# Altium footprint library Eis_Lib.PcbLib: 75 footprints (part 4 of 5)
Each footprint in its own frame and in the unit in brackets; x right, y up, seen from the top. Pads: shape width x height; smd on the part's side, far side on the other; paste and mask are expansions set on the pad; w line width, h text height; cw(c..) or ccw(c..) is an arc to the next point about the centre after c.
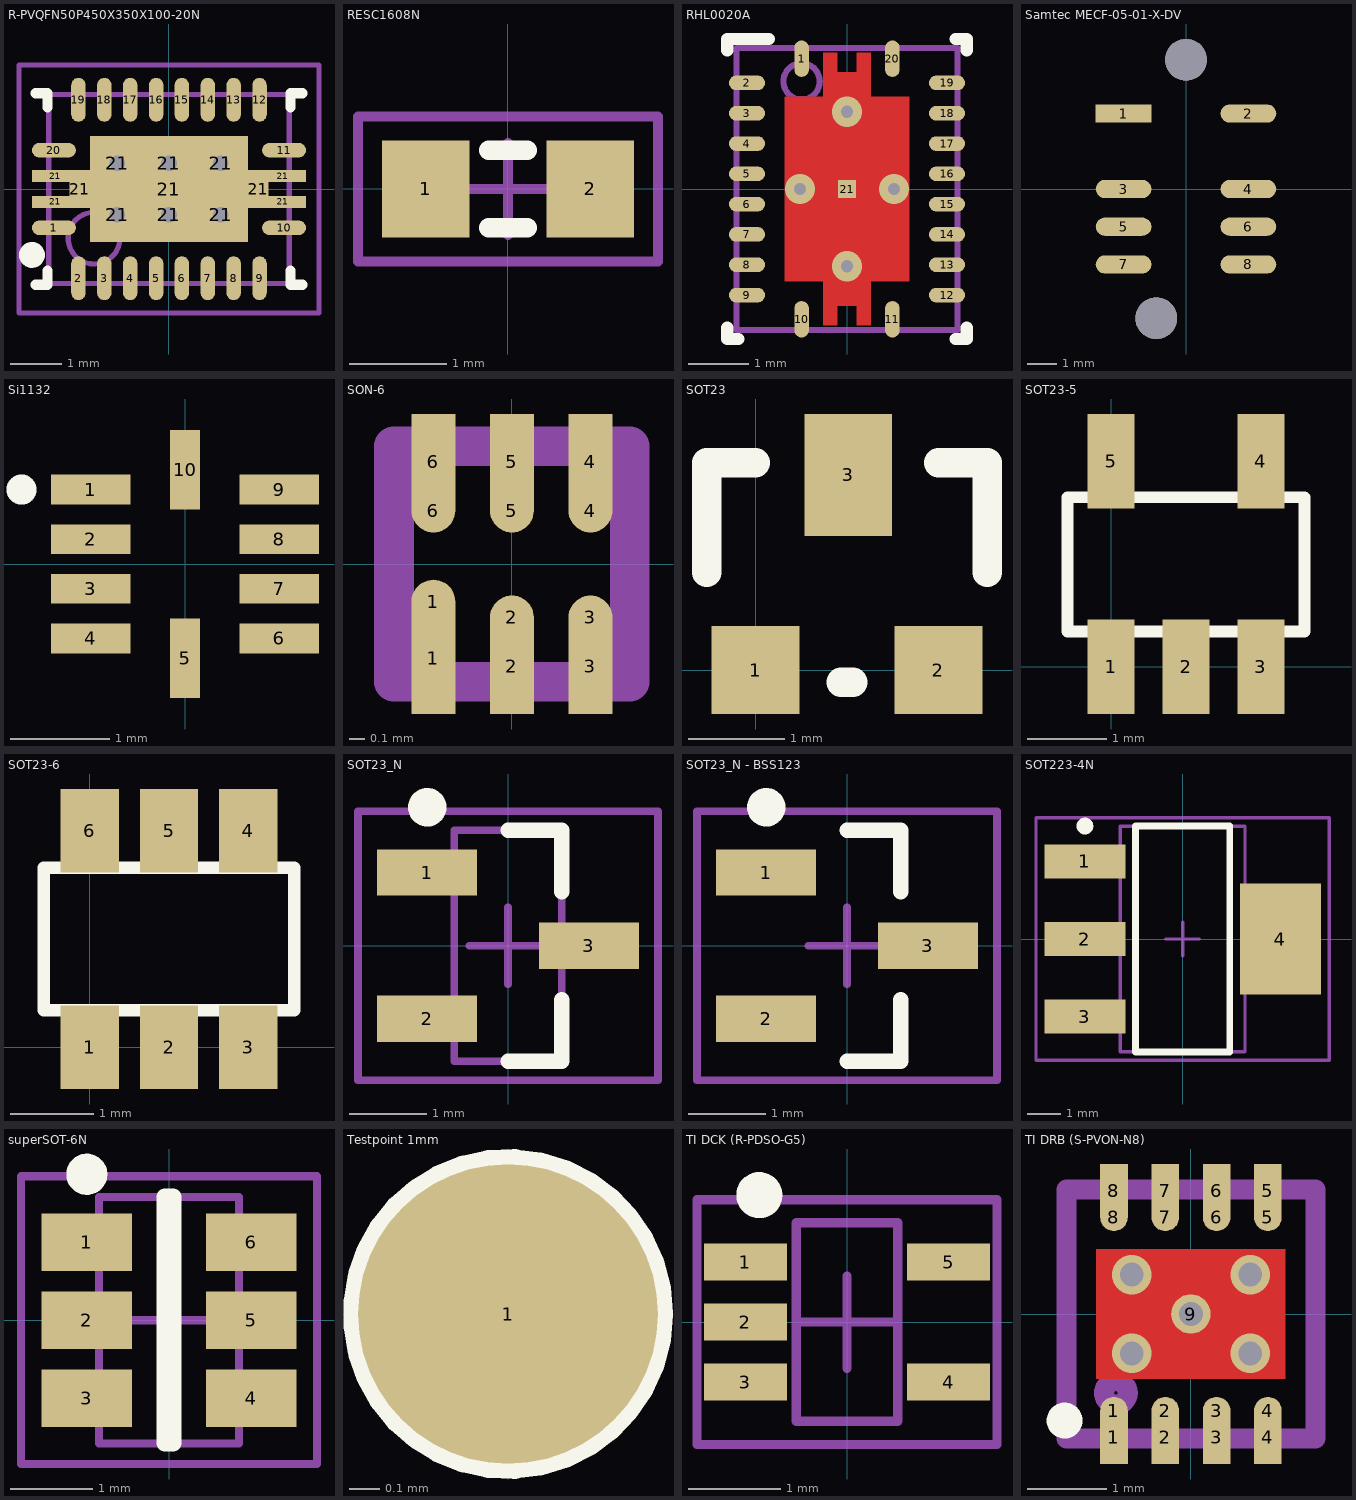
[diagram p3: the footprints below, top view; thin cyan lines are the x and y axes]

## R-PVQFN50P450X350X100-20N [mm] "R-PVQFN-N20, 20-Leads, Body 3,7x4,7mm (max), Pitch 0,50mm, IPC Medium Density"
height 1
pads (33):
  oval 0.85x0.28 smd mask+0.02: 1(-2.225,-0.75) 10(2.225,-0.75) 11(2.225,0.75) 20(-2.225,0.75)
  oval 0.28x0.85 smd mask+0.02: 2(-1.75,-1.725) 3(-1.25,-1.725) 4(-0.75,-1.725) 5(-0.25,-1.725) 6(0.25,-1.725) 7(0.75,-1.725) 8(1.25,-1.725) 9(1.75,-1.725) 12(1.75,1.725) 13(1.25,1.725) 14(0.75,1.725) 15(0.25,1.725) 16(-0.25,1.725) 17(-0.75,1.725) 18(-1.25,1.725) 19(-1.75,1.725)
  rect 0.9x0.23 smd mask+0.02: 21(-2.2,-0.25) 21(-2.2,0.25) 21(2.2,-0.25) 21(2.2,0.25)
  rect 0.4x0.73 smd paste-1 mask+0.02: 21(-1.725,0) 21(1.725,0)
  round 0.6 hole 0.3 paste-1 mask+0.02: 21(-1,-0.5) 21(-1,0.5) 21(0,-0.5) 21(0,0.5) 21(1,-0.5) 21(1,0.5)
  rect 3.05x2.05 smd paste-3 mask+0.02: 21(0,0)
Top Overlay:
  circle w0.25: c-2.65,-1.275 r0.125
  lines w0.2: -2.575,-1.85 -2.35,-1.85 -2.35,-1.575 ; -2.575,1.85 -2.35,1.85 -2.35,1.575 ; 2.35,-1.575 2.35,-1.85 2.575,-1.85 ; 2.35,1.575 2.35,1.85 2.575,1.85
Top Paste:
  rectangle: -1.47,-0.97 -0.15,-0.15
  rectangle: 0.15,-0.97 1.47,-0.15
  rectangle: 0.15,0.15 1.47,0.97
  rectangle: -1.47,0.15 -0.15,0.97
Mechanical 13:
  circle w0.1: c-1.45,-0.95 r0.5
  lines w0.1: -2.325,-1.825 2.325,-1.825 2.325,1.825 -2.325,1.825 -2.325,-1.825
Mechanical 15:
  lines w0.1: -0.5,0 0.5,0 ; 0,-0.5 0,0.5 ; -2.9,-2.4 2.9,-2.4 2.9,2.4 -2.9,2.4 -2.9,-2.4
3D body: height 1, standoff 0.01, extent -2.325,-1.825 2.325,1.825

## RESC1608N [mm] "Chip Resistor, Body 1.6x0.8mm, IPC Medium Density"
height 0.6
pads (2):
  rect 0.9x1 smd: 1(-0.85,0) 2(0.85,0)
Top Overlay:
  lines w0.2: -0.2,-0.4 0.2,-0.4 ; -0.2,0.4 0.2,0.4
Mechanical 15:
  lines w0.1: -0.475,0 0.475,0 ; 0,-0.475 0,0.475 ; -1.55,-0.75 -1.55,0.75 1.55,0.75 1.55,-0.75 -1.55,-0.75
3D body: height 0.45, standoff -0.02, extent -0.8,-0.4 0.8,0.4

## RHL0020A [mm] "QFN, 20-Leads, Body 4.5x3.5mm, Pitch 0.5mm, Thermal Pad 3.05x2.05mm, TI Recommended"
height 1
pads (21):
  oval 0.24x0.6 smd: 1(-0.75,2.15) 10(-0.75,-2.15) 11(0.75,-2.15) 20(0.75,2.15)
  oval 0.6x0.24 smd: 2(-1.65,1.75) 3(-1.65,1.25) 4(-1.65,0.75) 5(-1.65,0.25) 6(-1.65,-0.25) 7(-1.65,-0.75) 8(-1.65,-1.25) 9(-1.65,-1.75) 12(1.65,-1.75) 13(1.65,-1.25) 14(1.65,-0.75) 15(1.65,-0.25) 16(1.65,0.25) 17(1.65,0.75) 18(1.65,1.25) 19(1.65,1.75)
  rect 0.3x0.3 smd paste-0.15 mask+0: 21(0,0)
via 0,-1.275 diameter 0.5 hole 0.2
via 0.775,0 diameter 0.5 hole 0.2
via 0,1.275 diameter 0.5 hole 0.2
via -0.775,0 diameter 0.5 hole 0.2
Top Layer:
  region: 0.16,2.25 0.16,1.925 -0.16,1.925 -0.16,2.25 -0.39,2.25 -0.39,1.525 -1.025,1.525 -1.025,-1.525 -0.39,-1.525 -0.39,-2.25 -0.16,-2.25 -0.16,-1.925 0.16,-1.925 0.16,-2.25 0.39,-2.25 0.39,-1.525 1.025,-1.525 1.025,1.525 0.39,1.525 0.39,2.25
Top Overlay:
  lines w0.2: -1.975,-2.29 -1.975,-2.475 -1.79,-2.475 ; -1.975,2.29 -1.975,2.475 -1.29,2.475 ; 1.79,-2.475 1.975,-2.475 1.975,-2.29 ; 1.79,2.475 1.975,2.475 1.975,2.29
Top Paste:
  rectangle: -0.39,-1.925 0.39,-1.628
  rectangle: -0.39,1.628 0.39,1.925
  rectangle: 0.1,0.1 1.017,1.428
  region: -0.1,1.428 -1.017,1.428 -1.017,0.1 -0.1,0.1
  region: -0.1,-0.1 -1.017,-0.1 -1.017,-1.428 -0.1,-1.428
  rectangle: 0.1,-1.428 1.017,-0.1
Mechanical 5:
  circle w0.1: c-0.75,1.775 r0.3
  lines w0.1: -1.825,-2.325 -1.825,2.325 1.825,2.325 1.825,-2.325 -1.825,-2.325
  text ".Designator" at -0.355,-0.648 h0.76
3D body: height 1.01, standoff 0.5, extent -1.049,1.476 -0.451,2.074
3D body: height 1, standoff 0, extent -1.825,-2.325 1.825,2.325

## Samtec MECF-05-01-X-DV [mm]
pads (10):
  rect 1.88x0.61 smd: 1(-2.1,2.54)
  oval 1.88x0.61 smd: 2(2.1,2.54) 3(-2.1,0) 4(2.1,0) 5(-2.1,-1.27) 6(2.1,-1.27) 7(-2.1,-2.54) 8(2.1,-2.54)
  round 1.4 hole 1.4: ""(-1,-4.35) ""(0,4.35)
3D body: height 8.75, standoff -1.3, extent -2.801,-5.232 2.801,5.232

## Si1132 [mm] "QFN, 2.5x2.5mm, 10polig - für Si1132-Sensor"
height 0.65
pads (10):
  rect 0.8x0.3 smd: 1(-0.95,0.75) 2(-0.95,0.25) 3(-0.95,-0.25) 4(-0.95,-0.75) 6(0.95,-0.75) 7(0.95,-0.25) 8(0.95,0.25) 9(0.95,0.75)
  rect 0.3x0.8 smd: 5(0,-0.95) 10(0,0.95)
Top Overlay:
  circle w0.254: c-1.65,0.75 r0.025
3D body: height 0.65, standoff 0, extent -1.25,-1.25 1.25,1.25

## SON-6 [mm] "DSE-Package 1,5x1,5mm 6polig z. B. TPS72718"
pads (12):
  rect 0.28x0.71 smd mask+0.03: 1(-0.5,-0.6)
  round 0.28 smd mask+0.03: 1(-0.5,-0.24) 2(0,-0.34) 3(0.5,-0.34) 4(0.5,0.34) 5(0,0.34) 6(-0.5,0.34)
  rect 0.28x0.61 smd mask+0.03: 2(0,-0.65) 3(0.5,-0.65) 4(0.5,0.65) 5(0,0.65) 6(-0.5,0.65)
Mechanical 13:
  lines w0.254: -0.75,-0.75 0.75,-0.75 0.75,0.75 -0.75,0.75 -0.75,-0.75
3D body: height 0.7, standoff 0.05, extent -0.749,-0.749 0.749,0.749

## SOT23 [mil] "SOT23"
pads (3):
  rect 36x36 smd: 1(0,0) 2(75,0)
  rect 36x50 smd: 3(38,80)
Top Overlay:
  lines w12: -20,40 -20,85 0,85 ; 35,-5 40,-5 ; 75,85 95,85 95,40
3D body: height 40.16, standoff 0, extent -18.11,-9.84 96.85,87.64

## SOT23-5 [mm]
pads (5):
  rect 0.6x1.2 smd: 1(0,0) 2(0.95,0) 3(1.9,0) 4(1.9,2.6) 5(0,2.6)
Top Overlay:
  lines w0.15: -0.55,0.445 -0.55,2.145 2.45,2.145 2.45,0.445 -0.55,0.445
3D body: height 1.1, standoff 0, extent -0.499,-0.2 2.4,2.6

## SOT23-6 [mm]
height 3
pads (6):
  rect 0.7x1 smd: 1(0,0) 2(0.95,0) 3(1.9,0) 4(1.9,2.59) 5(0.95,2.59) 6(0,2.59)
Top Overlay:
  lines w0.15: -0.55,0.445 -0.55,2.145 2.45,2.145 2.45,0.445 -0.55,0.445
3D body: height 1.09, standoff 0, extent -0.444,0.146 2.35,2.572

## SOT23_N [mm] "SOT23, 3-Leads, Body 2.9x1.3mm, Pitch 0.95mm, Lead Span 2.3mm, IPC Medium Density"
height 1.1
pads (3):
  rect 1.3x0.6 smd: 1(-1.05,0.95) 2(-1.05,-0.95) 3(1.05,0)
Top Overlay:
  circle w0.25: c-1.05,1.8 r0.125
  lines w0.2: 0,-1.5 0.7,-1.5 0.7,-0.7 ; 0,1.5 0.7,1.5 0.7,0.7
Mechanical 13:
  lines w0.1: -0.7,-1.5 -0.7,1.5 0.7,1.5 0.7,-1.5 -0.7,-1.5
Mechanical 15:
  lines w0.1: -0.5,0 0.5,0 ; 0,-0.5 0,0.5 ; -1.95,-1.75 -1.95,1.75 1.95,1.75 1.95,-1.75 -1.95,-1.75
3D body: height 1.1, standoff 0, extent -0.7,-1.5 0.7,1.5

## SOT23_N - BSS123 [mm] "SOT23, 3-Leads, Body 2.9x1.3mm, Pitch 0.95mm, Lead Span 2.3mm, IPC Medium Density"
height 1.1
pads (3):
  rect 1.3x0.6 smd: 1(-1.05,0.95) 2(-1.05,-0.95) 3(1.05,0)
Top Overlay:
  circle w0.25: c-1.05,1.8 r0.125
  lines w0.2: 0,-1.5 0.7,-1.5 0.7,-0.7 ; 0,1.5 0.7,1.5 0.7,0.7
Mechanical 15:
  lines w0.1: -0.5,0 0.5,0 ; 0,-0.5 0,0.5 ; -1.95,-1.75 1.95,-1.75 1.95,1.75 -1.95,1.75 -1.95,-1.75
3D body: height 1, standoff 0, extent -1.15,-1.45 1.15,1.45

## SOT223-4N [mm] "SOT223, 4-Leads, Body 6.5x3.5mm, Pitch 2.3mm, Lead Span 7mm, IPC Medium Density"
height 1.7
pads (4):
  rect 2.4x1 smd: 1(-2.9,2.3) 2(-2.9,0) 3(-2.9,-2.3)
  rect 2.4x3.3 smd: 4(2.9,0)
Top Overlay:
  circle w0.25: c-2.9,3.35 r0.125
  lines w0.2: -1.4,-3.35 -1.4,3.35 1.4,3.35 1.4,-3.35 -1.4,-3.35
Mechanical 13:
  lines w0.1: -1.85,-3.35 -1.85,3.35 1.85,3.35 1.85,-3.35 -1.85,-3.35
Mechanical 15:
  lines w0.1: -0.5,0 0.5,0 ; 0,-0.5 0,0.5 ; -4.35,-3.6 -4.35,3.6 4.35,3.6 4.35,-3.6 -4.35,-3.6
3D body: height 1.7, standoff 0, extent -1.85,-3.35 1.85,3.35

## superSOT-6N [mm] "SOT23, 6-Leads, Body 3,0x2,6mm (max), Pitch 0,95mm, IPC Medium Density"
height 1.1
pads (6):
  rect 1.1x0.7 smd mask+0.05: 1(-1,0.95) 2(-1,0) 3(-1,-0.95) 4(1,-0.95) 5(1,0) 6(1,0.95)
Top Overlay:
  circle w0.25: c-1,1.775 r0.125
  lines w0.2: -0.05,-1.5 0.05,-1.5 0.05,1.5 -0.05,1.5 -0.05,-1.5
Mechanical 13:
  lines w0.1: -0.85,-1.5 -0.85,1.5 0.85,1.5 0.85,-1.5 -0.85,-1.5
Mechanical 15:
  lines w0.1: -0.5,0 0.5,0 ; 0,-0.5 0,0.5 ; -1.8,-1.75 -1.8,1.75 1.8,1.75 1.8,-1.75 -1.8,-1.75
3D body: height 1.1, standoff 0.05, extent -0.85,-1.5 0.85,1.5

## Testpoint 1mm [mm] "Testpoint 1mm"
height 1.75
pads (1):
  round 1 smd paste-1: 1(0,0)
Top Overlay:
  circle w0.1: c0,0 r0.5
Mechanical 11:
  lines w0.1: -0.225,0 0.225,0 ; 0,-0.225 0,0.225

## TI DCK (R-PDSO-G5) [mm] "TI DCK (SC70-5)"
height 1.1
pads (5):
  rect 0.9x0.4 smd paste-0.025 mask+0.05: 1(-1.1,0.65) 2(-1.1,0) 3(-1.1,-0.65) 4(1.1,-0.65) 5(1.1,0.65)
Top Overlay:
  circle w0.25: c-0.95,1.375 r0.125
Mechanical 13:
  lines w0.1: -0.55,-1.075 0.55,-1.075 0.55,1.075 -0.55,1.075 -0.55,-1.075
Mechanical 15:
  lines w0.1: -0.5,0 0.5,0 ; 0,-0.5 0,0.5 ; -1.625,-1.325 1.625,-1.325 1.625,1.325 -1.625,1.325 -1.625,-1.325
3D body: height 1.1, standoff 0.1, extent -0.55,-1.075 0.55,1.075

## TI DRB (S-PVON-N8) [mm] "TI DRB; 8 Pin; OPA2333"
height 1
pads (17):
  rect 0.35x0.675 smd paste-0.025 mask+0.07: 1(-0.975,-1.562) 2(-0.325,-1.562) 3(0.325,-1.562) 4(0.975,-1.562) 5(0.975,1.562) 6(0.325,1.562) 7(-0.325,1.562) 8(-0.975,1.562)
  round 0.35 smd paste-0.025 mask+0.07: 1(-0.975,-1.225) 2(-0.325,-1.225) 3(0.325,-1.225) 4(0.975,-1.225) 5(0.975,1.225) 6(0.325,1.225) 7(-0.325,1.225) 8(-0.975,1.225)
  round 0.5 hole 0.3: 9(0,0)
via -0.75,0.5 diameter 0.5 hole 0.3
via 0.75,0.5 diameter 0.5 hole 0.3
via 0.75,-0.5 diameter 0.5 hole 0.3
via -0.75,-0.5 diameter 0.5 hole 0.3
Top Layer:
  rectangle: -1.2,-0.825 1.2,0.825
Top Overlay:
  circle w0.254: c-1.6,-1.35 r0.1
Top Paste:
  rectangle: 0.125,-0.775 1.125,-0.125
  rectangle: 0.125,0.125 1.125,0.775
  rectangle: -1.125,-0.775 -0.125,-0.125
  rectangle: -1.125,0.125 -0.125,0.775
Top Solder:
  rectangle: -1.2,-0.825 1.2,0.825
Mechanical 1:
  circle w0.254: c-0.95,-1 r0.15
  lines w0.254: -1.575,-1.575 -1.575,1.575 1.575,1.575 1.575,-1.575 -1.575,-1.575
3D body: height 1.01, standoff 0, extent -1.099,-1.149 -0.801,-0.851
3D body: height 1, standoff 0, extent -1.574,-1.574 1.575,1.575